# Altium footprint library CH3.96.PcbLib: 24 footprints (part 2 of 2)
Each footprint in its own frame and in the unit in brackets; x right, y up, seen from the top. Pads: shape width x height; smd on the part's side, far side on the other; paste and mask are expansions set on the pad; w line width, h text height; cw(c..) or ccw(c..) is an arc to the next point about the centre after c.
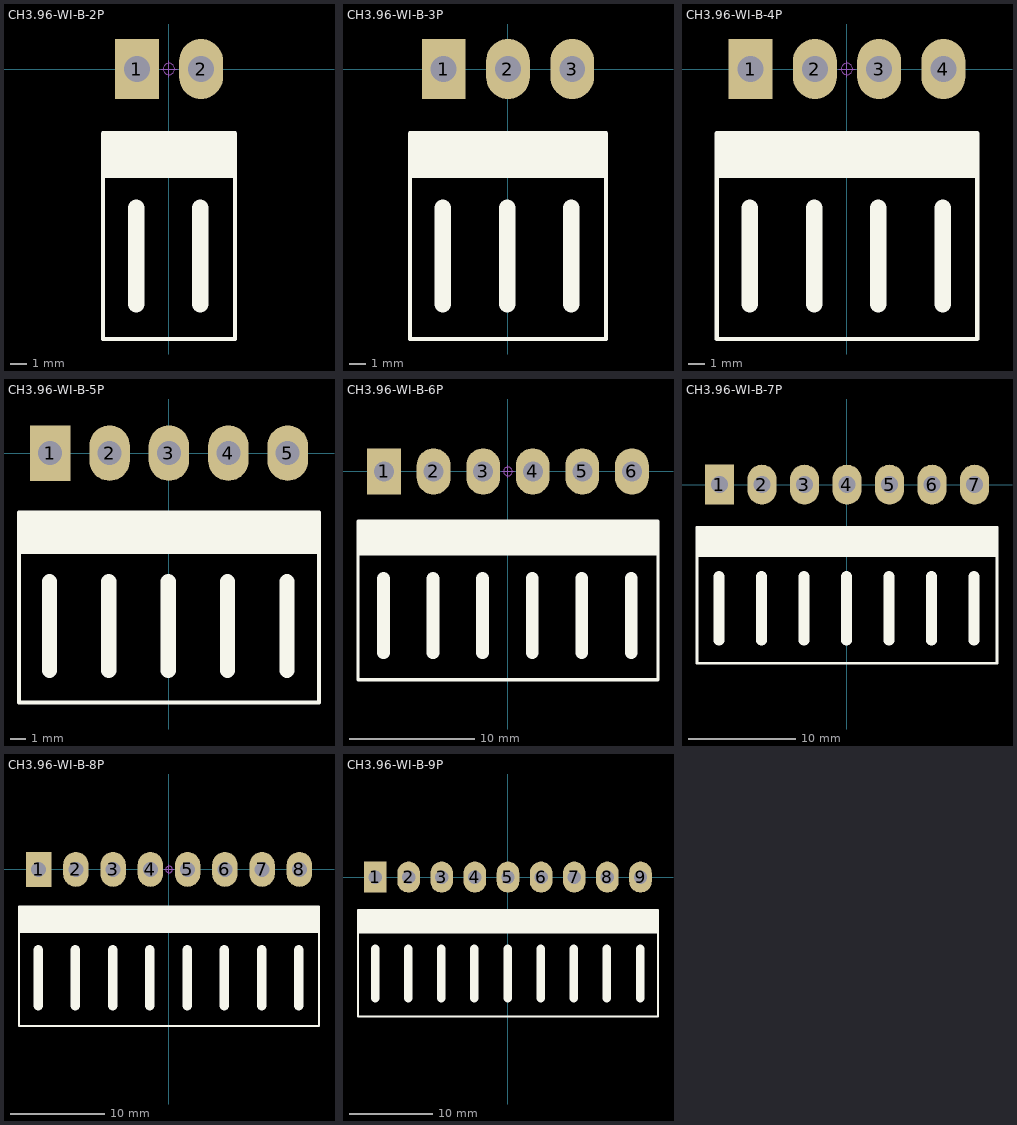
[diagram p1: the footprints below, top view; thin cyan lines are the x and y axes]

## CH3.96-WI-B-2P [mm] "卧插，脚距：3.96"
pads (2):
  rect 2.7x3.7 hole 1.6: 1(-1.98,0)
  oval 2.7x3.7 hole 1.6: 2(1.98,0)
Top Overlay:
  rectangle: -4.064,-6.731 4.065,-3.96
  lines w0.254: -4.064,-16.637 4.066,-16.637 4.065,-3.96 -4.064,-3.96 -4.064,-16.637
  lines w1.016: -2.032,-14.495 -2.032,-8.555 ; 1.928,-14.495 1.928,-8.555
Mechanical 15:
  circle w0.05: c0,0 r0.35
  lines w0.05: -0.5,0 0.5,0 ; 0,-0.5 0,0.5
3D body: height 9.75, standoff -3.45, extent -3.96,-16.5 3.96,0.6

## CH3.96-WI-B-3P [mm] "卧插，脚距：3.96"
pads (3):
  rect 2.7x3.7 hole 1.6: 1(-3.96,0)
  oval 2.7x3.7 hole 1.6: 2(0,0) 3(3.96,0)
Top Overlay:
  rectangle: -6.044,-6.731 5.94,-3.96
  lines w0.254: -6.044,-16.637 6.046,-16.637 6.045,-3.96 -6.044,-3.96 -6.044,-16.637
  lines w1.016: -4.012,-14.495 -4.012,-8.555 ; -0.052,-14.495 -0.052,-8.555 ; 3.908,-14.495 3.908,-8.555
Mechanical 15:
  circle w0.05: c0,0 r0.35
  lines w0.05: -0.5,0 0.5,0 ; 0,-0.5 0,0.5
3D body: height 9.75, standoff -3.45, extent -5.94,-16.5 5.94,0.6

## CH3.96-WI-B-4P [mm] "卧插，脚距：3.96"
pads (4):
  rect 2.7x3.7 hole 1.6: 1(-5.94,0)
  oval 2.7x3.7 hole 1.6: 2(-1.98,0) 3(1.98,0) 4(5.94,0)
Top Overlay:
  rectangle: -8.024,-6.731 7.92,-3.96
  lines w0.254: -8.024,-16.637 -8.024,-3.96 8.025,-3.96 8.026,-16.637 -8.024,-16.637
  lines w1.016: -5.992,-14.495 -5.992,-8.555 ; -2.032,-14.495 -2.032,-8.555 ; 1.928,-14.495 1.928,-8.555 ; 5.888,-14.495 5.888,-8.555
Mechanical 15:
  circle w0.05: c0,0 r0.35
  lines w0.05: -0.5,0 0.5,0 ; 0,-0.5 0,0.5
3D body: height 9.75, standoff -3.45, extent -7.92,-16.5 7.92,0.6

## CH3.96-WI-B-5P [mm] "卧插，脚距：3.96"
pads (5):
  rect 2.7x3.7 hole 1.6: 1(-7.92,0)
  oval 2.7x3.7 hole 1.6: 2(-3.96,0) 3(0,0) 4(3.96,0) 5(7.92,0)
Top Overlay:
  rectangle: -10.004,-6.731 9.9,-3.96
  lines w0.254: -10.004,-16.637 -10.004,-3.96 10.006,-3.96 10.006,-16.637 -10.004,-16.637
  lines w1.016: -7.972,-14.495 -7.972,-8.555 ; -4.012,-14.495 -4.012,-8.555 ; -0.052,-14.495 -0.052,-8.555 ; 3.908,-14.495 3.908,-8.555 ; 7.868,-14.495 7.868,-8.555
Mechanical 15:
  circle w0.05: c0,0 r0.35
  lines w0.05: -0.5,0 0.5,0 ; 0,-0.5 0,0.5
3D body: height 9.75, standoff -3.45, extent -9.9,-16.5 9.9,0.6

## CH3.96-WI-B-6P [mm] "卧插，脚距：3.96"
pads (6):
  rect 2.7x3.7 hole 1.6: 1(-9.9,0)
  oval 2.7x3.7 hole 1.6: 2(-5.94,0) 3(-1.98,0) 4(1.98,0) 5(5.94,0) 6(9.9,0)
Top Overlay:
  rectangle: -11.984,-6.731 11.88,-3.96
  lines w0.254: -11.984,-16.637 11.986,-16.637 11.986,-3.96 -11.984,-3.96 -11.984,-16.637
  lines w1.016: -9.952,-14.495 -9.952,-8.555 ; -5.992,-14.495 -5.992,-8.555 ; -2.032,-14.495 -2.032,-8.555 ; 1.928,-14.495 1.928,-8.555 ; 5.888,-14.495 5.888,-8.555 ; 9.848,-14.495 9.848,-8.555
Mechanical 15:
  circle w0.05: c0,0 r0.35
  lines w0.05: -0.5,0 0.5,0 ; 0,-0.5 0,0.5
3D body: height 9.75, standoff -3.45, extent -11.88,-16.5 11.88,0.6

## CH3.96-WI-B-7P [mm] "卧插，脚距：3.96"
pads (7):
  rect 2.7x3.7 hole 1.6: 1(-11.88,0)
  oval 2.7x3.7 hole 1.6: 2(-7.92,0) 3(-3.96,0) 4(0,0) 5(3.96,0) 6(7.92,0) 7(11.88,0)
Top Overlay:
  rectangle: -13.964,-6.731 13.86,-3.96
  lines w0.254: -13.964,-16.637 -13.964,-3.96 13.966,-3.96 13.966,-16.637 -13.964,-16.637
  lines w1.016: -11.932,-14.495 -11.932,-8.555 ; -7.972,-14.495 -7.972,-8.555 ; -4.012,-14.495 -4.012,-8.555 ; -0.052,-14.495 -0.052,-8.555 ; 3.908,-14.495 3.908,-8.555 ; 7.868,-14.495 7.868,-8.555 ; 11.828,-14.495 11.828,-8.555
Mechanical 15:
  circle w0.05: c0,0 r0.35
  lines w0.05: -0.5,0 0.5,0 ; 0,-0.5 0,0.5
3D body: height 9.75, standoff -3.45, extent -13.86,-16.5 13.86,0.6

## CH3.96-WI-B-8P [mm] "卧插，脚距：3.96"
pads (8):
  rect 2.7x3.7 hole 1.6: 1(-13.86,0)
  oval 2.7x3.7 hole 1.6: 2(-9.9,0) 3(-5.94,0) 4(-1.98,0) 5(1.98,0) 6(5.94,0) 7(9.9,0) 8(13.86,0)
Top Overlay:
  rectangle: -15.944,-6.731 15.84,-3.96
  lines w0.254: 15.84,-3.96 -15.944,-3.96 -15.944,-16.637 15.946,-16.637 15.946,-3.96
  lines w1.016: -13.912,-14.495 -13.912,-8.555 ; -9.952,-14.495 -9.952,-8.555 ; -5.992,-14.495 -5.992,-8.555 ; -2.032,-14.495 -2.032,-8.555 ; 1.928,-14.495 1.928,-8.555 ; 5.888,-14.495 5.888,-8.555 ; 9.848,-14.495 9.848,-8.555 ; 13.808,-14.495 13.808,-8.555
Mechanical 15:
  circle w0.05: c0,0 r0.35
  lines w0.05: -0.5,0 0.5,0 ; 0,-0.5 0,0.5
3D body: height 9.75, standoff -3.45, extent -15.84,-16.5 15.84,0.6

## CH3.96-WI-B-9P [mm] "卧插，脚距：3.96"
pads (9):
  rect 2.7x3.7 hole 1.6: 1(-15.84,0)
  oval 2.7x3.7 hole 1.6: 2(-11.88,0) 3(-7.92,0) 4(-3.96,0) 5(0,0) 6(3.96,0) 7(7.92,0) 8(11.88,0) 9(15.84,0)
Top Overlay:
  rectangle: -17.924,-6.731 17.82,-3.96
  lines w0.254: 17.82,-3.96 -17.924,-3.96 -17.924,-16.637 17.926,-16.637 17.926,-3.96
  lines w1.016: -15.892,-14.495 -15.892,-8.555 ; -11.932,-14.495 -11.932,-8.555 ; -7.972,-14.495 -7.972,-8.555 ; -4.012,-14.495 -4.012,-8.555 ; -0.052,-14.495 -0.052,-8.555 ; 3.908,-14.495 3.908,-8.555 ; 7.868,-14.495 7.868,-8.555 ; 11.828,-14.495 11.828,-8.555 ; 15.788,-14.495 15.788,-8.555
Mechanical 15:
  circle w0.05: c0,0 r0.35
  lines w0.05: -0.5,0 0.5,0 ; 0,-0.5 0,0.5
3D body: height 9.75, standoff -3.45, extent -17.82,-16.5 17.82,0.6